# Altium footprint library iuh-thuc-hanh.PcbLib: 63 footprints (part 2 of 4)
Each footprint in its own frame and in the unit in brackets; x right, y up, seen from the top. Pads: shape width x height; smd on the part's side, far side on the other; paste and mask are expansions set on the pad; w line width, h text height; cw(c..) or ccw(c..) is an arc to the next point about the centre after c.
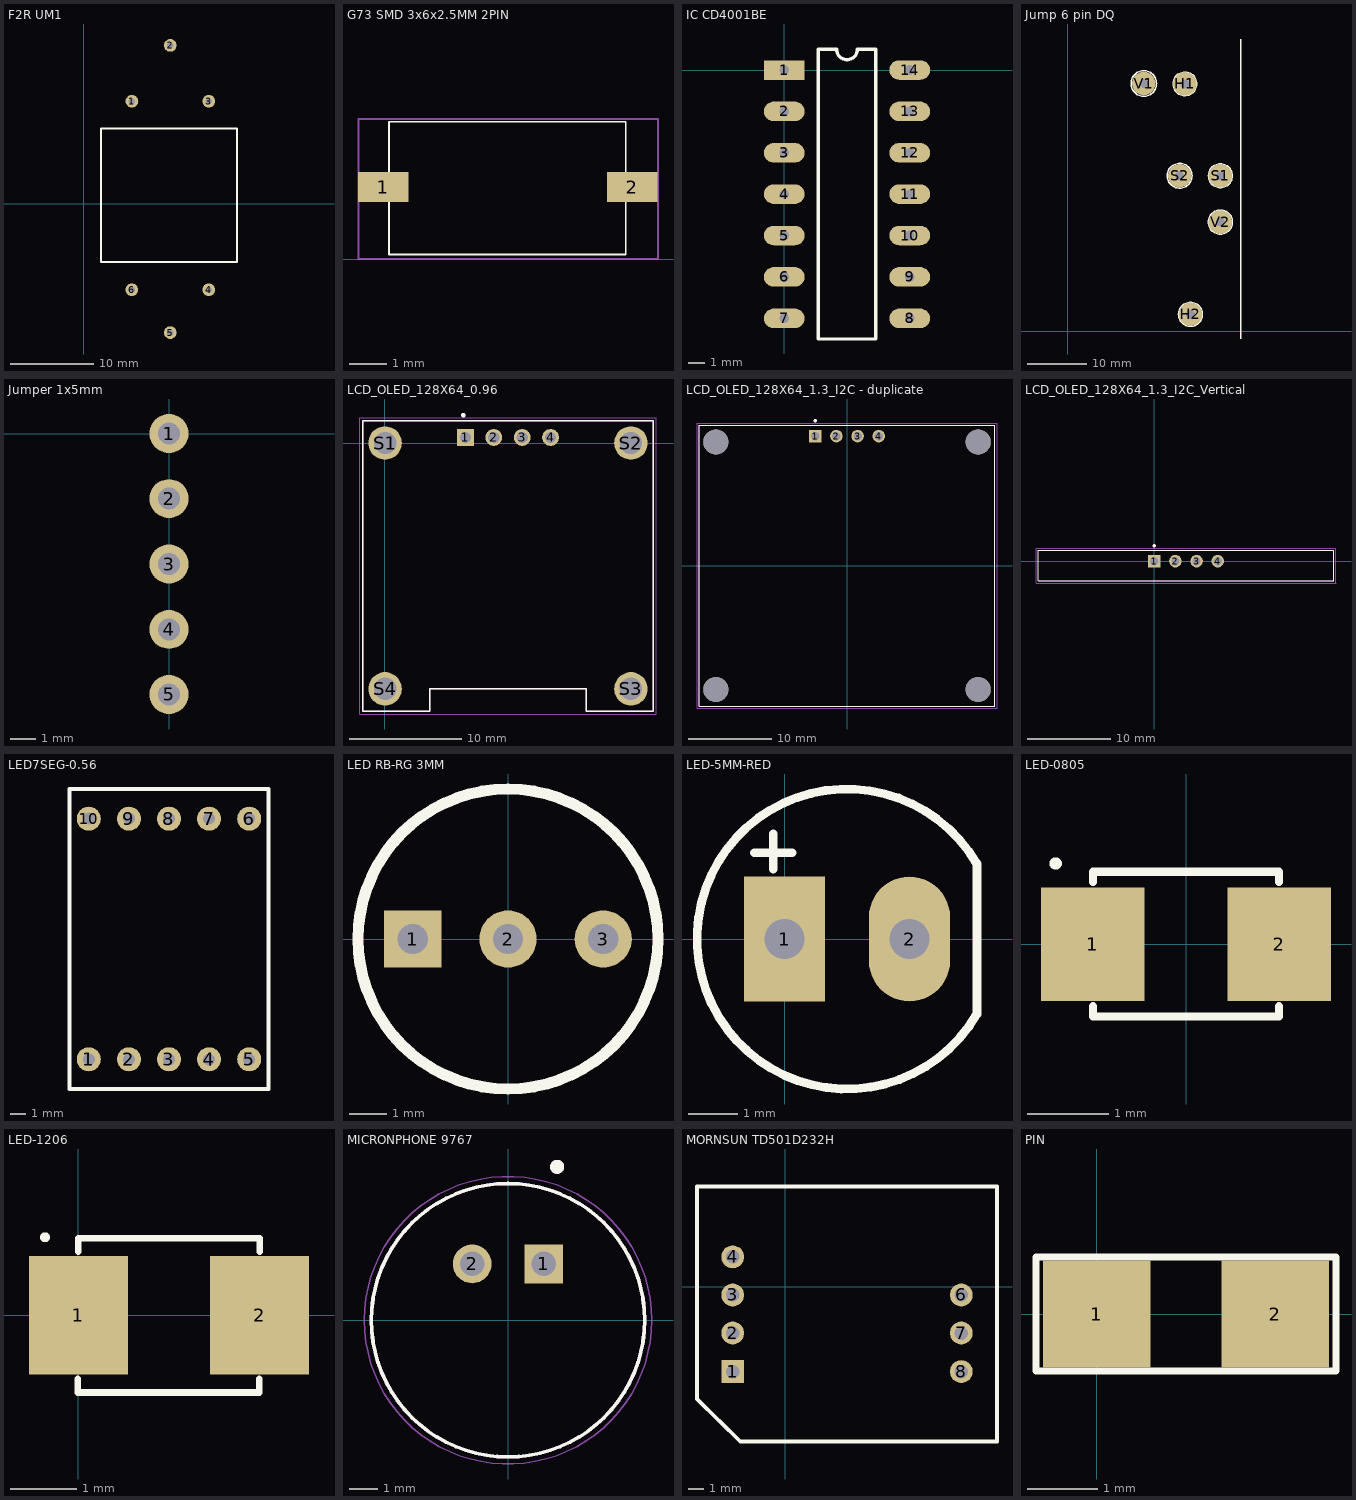
[diagram p1: the footprints below, top view; thin cyan lines are the x and y axes]

## F2R UM1 [mil]
pads (6):
  round 60 hole 30: 1(227.79,482.5) 2(408.58,745.59) 3(590,482.5) 4(589.71,-405) 5(408.58,-606.85) 6(227.5,-405)
Top Overlay:
  lines w10: 82.5,-275 722.5,-275 722.5,337.5 722.5,355 82.5,355 82.5,-275
3D body: height 314.96, standoff 0, extent 77.5,-275 720,357.5

## G73 SMD 3x6x2.5MM 2PIN [mm] "Tactile Tact Push Button Micro Switch"
pads (2):
  rect 1.35x0.8 smd mask+0.102: 1(1.829,1.93) 2(8.509,1.93)
Top Overlay:
  lines w0.05: 1.981,0.127 1.981,3.683 8.331,3.683 8.331,0.127 1.981,0.127
Mechanical 15:
  lines w0.05: 1.168,0 9.195,0 9.195,3.759 1.168,3.759 1.168,0
3D body "G73 button.STEP": height 2.5, standoff 0, extent 1.168,0.155 9.168,3.655

## IC CD4001BE [mm]
pads (14):
  rect 2.5x1.2 hole 0.6: 1(0,0)
  oval 2.5x1.2 hole 0.6: 2(0,-2.54) 3(0,-5.08) 4(0,-7.62) 5(0,-10.16) 6(0,-12.7) 7(0,-15.24) 8(7.7,-15.24) 9(7.7,-12.7) 10(7.7,-10.16) 11(7.7,-7.62) 12(7.7,-5.08) 13(7.7,-2.54) 14(7.7,0)
Top Overlay:
  lines w0.2: 2.085,-16.51 5.615,-16.51 5.615,1.27 4.485,1.27 cw(c3.85,1.27) 3.215,1.27 2.085,1.27 2.085,-16.51

## Jump 6 pin DQ [mm]
pads (6):
  round 4 hole 1.5: H1(19.875,42.037) H2(20.828,2.857) S1(25.908,26.416) S2(18.986,26.416) V1(12.89,42.1) V2(25.908,18.542)
Top Overlay:
  circle w0.254: c20.828,2.857 r2.041
  circle w0.254: c25.908,18.542 r2.048
  circle w0.254: c25.908,26.416 r2.032
  circle w0.254: c18.986,26.416 r2.111
  circle w0.254: c19.875,42.037 r2.005
  circle w0.254: c12.89,42.1 r2.172
  lines w0.254: 29.41,-1.333 29.41,49.666

## Jumper 1x5mm [mil] "Jumper 1x5-2.54mm"
pads (5):
  round 60 hole 33.46: 1(0,0) 2(0,-100) 3(0,-200.46) 4(0,-300.85) 5(0,-400.85)
3D body "Header, Male, 2.54mm, 1x5.STEP": height 336.22, standoff -118.11, extent -50.12,-450.85 49.88,49.15

## LCD_OLED_128X64_0.96 [mm] "I2C-"
pads (8):
  rect 1.508x1.508 / inner round 1.508 / far side rect 1.508x1.508 hole 1: 1(7.215,0.525)
  round 1.508 hole 1: 2(9.755,0.525) 3(12.295,0.525) 4(14.835,0.525)
  round 3 hole 2: S1(0.025,0.025) S2(22.025,0.025) S3(22.025,-21.975) S4(0.025,-21.975)
Top Overlay:
  circle w0.2: c7.025,2.525 r0.1
  lines w0.127: -1.975,-23.975 -1.975,2.025 24.025,2.025 24.025,-23.975 18.025,-23.975 18.025,-21.975 4.025,-21.975 4.025,-23.975 -1.975,-23.975
Mechanical 13:
  circle w0.2: c7.025,2.525 r0.1
  lines w0.127: -1.975,-23.975 -1.975,2.025 24.025,2.025 24.025,-23.975 18.025,-23.975 18.025,-21.975 4.025,-21.975 4.025,-23.975 -1.975,-23.975
Mechanical 15:
  lines w0.05: -2.225,-24.225 -2.225,2.275 24.275,2.275 24.275,-24.225 -2.225,-24.225
3D body "step_temp.STEP": height 5.66, standoff -5.64, extent -1.975,-23.975 24.025,2.025

## LCD_OLED_128X64_1.3_I2C - duplicate [mm]
pads (8):
  rect 1.508x1.508 / inner round 1.508 / far side rect 1.508x1.508 hole 1: 1(-3.81,15.55)
  round 1.508 hole 1: 2(-1.27,15.55) 3(1.27,15.55) 4(3.81,15.55)
  round 3 hole 3 unplated: ""(-15.75,-14.85) ""(-15.75,14.85) ""(15.75,-14.85) ""(15.75,14.85)
Top Overlay:
  circle w0.2: c-3.81,17.4 r0.1
  lines w0.127: -17.75,-16.85 -17.75,16.85 17.75,16.85 17.75,-16.85 -17.75,-16.85
Mechanical 13:
  circle w0.2: c-3.81,17.4 r0.1
  lines w0.127: -17.75,-16.85 -17.75,16.85 17.75,16.85 17.75,-16.85 -17.75,-16.85
Mechanical 15:
  lines w0.05: -18,-17.1 18,-17.1 18,17.1 -18,17.1 -18,-17.1
3D body "AZ-Delivery - OLED13 IIC.stp": height 2.1, standoff -9.1, extent -17.637,-16.133 17.764,17.367

## LCD_OLED_128X64_1.3_I2C_Vertical [mm]
pads (4):
  rect 1.508x1.508 / inner round 1.508 / far side rect 1.508x1.508 hole 1: 1(0,0.005)
  round 1.508 hole 1: 2(2.54,0.005) 3(5.08,0.005) 4(7.62,0.005)
Top Overlay:
  circle w0.2: c0,1.855 r0.1
  lines w0.127: -13.94,-2.372 -13.94,1.305 21.56,1.305 21.56,-2.372 -13.94,-2.372
Mechanical 13:
  circle w0.2: c0,1.855 r0.1
  lines w0.127: -13.94,1.305 21.56,1.305 21.56,-2.372 -13.737,-2.372
Mechanical 15:
  lines w0.05: -14.199,-2.622 21.819,-2.616 ; -14.19,-2.591 -14.19,1.555 21.81,1.555 21.81,-2.616
3D body "1x4.STEP": height 8.8, standoff -8.84, extent -1.194,-1.27 8.966,1.27

## LED7SEG-0.56 [mil]
pads (10):
  round 60 hole 30: 1(-2778.56,5986.53) 2(-2678.56,5986.53) 3(-2578.56,5986.53) 4(-2478.56,5986.53) 5(-2378.56,5986.53) 6(-2378.56,6586.53) 7(-2478.56,6586.53) 8(-2578.56,6586.53) 9(-2678.56,6586.53) 10(-2778.56,6586.53)
Top Overlay:
  lines w10: -2826.59,5912.52 -2826.59,6660.55 -2330.53,6660.55 -2330.53,5912.52 -2826.59,5912.52
3D body "Led 7 Segment 5611AS Red CC.STEP": height 314.96, standoff -78.74, extent -2823.03,5911.97 -2326.97,6660

## LED RB-RG 3MM [mil]
pads (3):
  rect 60x60 hole 31.5: 1(-100,0)
  round 60 hole 31.5: 2(0,0) 3(100,0)
Top Overlay:
  circle w11.81: c0,0 r157.48
3D body "Bi-Color LED - Common Cathode v3.step": height 405.51, standoff -925.2, extent -109.06,-74.26 109.06,74.26

## LED-5MM-RED [mil] "LED 2 PIN, 5mm, Only colour,pin to pin 100mil"
height 300
pads (2):
  rect 65x100 hole 32: 1(0,0)
  oval 65x100 hole 32: 2(100,0)
Top Overlay:
  lines w7: -24,69 6,69 ; -9,56 -9,84 ; 153.51,60.71 ccw(c50,0) 153.94,-59.97 ; 154,-59 154,60
3D body "SW3dPS-LEDd5R.STEP": height 339.18, standoff -243.49, extent -64.69,-119 148.69,117.99

## LED-0805 [mil]
pads (2):
  rect 50x55 smd: 1(-45,0) 2(45,0)
Top Overlay:
  circle w3.94: c-63,39 r1
  lines w4: -45,-30 -45,-35 45,-35 45,-30 ; -45,30 -45,35 45,35 45,30
3D body "User Library-led_0805-blue.step": height 43.31, standoff 0, extent -39.76,-24.6 39.77,24.61

## LED-1206 [mm]
pads (2):
  rect 1.5x1.8 smd: 1(0,0) 2(2.75,0)
Top Overlay:
  circle w0.1: c-0.506,1.185 r0.025
  lines w0.102: -0.007,-1.168 2.743,-1.168 2.743,-0.965 ; -0.007,-1.167 -0.007,-0.964 ; 0,0.965 0,1.168 2.75,1.168 ; 2.75,0.964 2.75,1.167
3D body "step_temp.STEP": height 1.2, standoff 0, extent -0.33,-0.8 2.87,0.8

## MICRONPHONE 9767 [mm]
pads (2):
  rect 1.378x1.378 hole 0.87: 1(1.27,2)
  round 1.378 hole 0.87: 2(-1.27,2)
Top Overlay:
  circle w0.127: c0,0 r4.85
  circle w0.3: c1.741,5.443 r0.1
Mechanical 13:
  circle w0.127: c0,0 r4.85
  circle w0.3: c1.741,5.443 r0.1
Mechanical 15:
  circle w0.05: c0,0 r5.1
3D body "electret mic 9.6x5x2.54 v5.step": height 5, standoff -2.73, extent -4.85,-4.596 4.85,5.104

## MORNSUN TD501D232H [mm]
pads (7):
  rect 1.524x1.524 hole 0.9: 1(-3.5,-5.65)
  round 1.524 hole 0.9: 2(-3.5,-3.08) 3(-3.5,-0.54) 4(-3.5,2) 6(11.74,-0.54) 7(11.74,-3.08) 8(11.74,-5.65)
Top Overlay:
  lines w0.254: -5.88,3.5 -5.88,3.645 -5.88,3.772 ; -5.88,-7.468 -5.88,6.69 14.12,6.69 14.12,-10.31 -3,-10.31 -5.88,-7.468
3D body "User Library-MORNSUN_TD301D232H.step": height 7.5, standoff -2, extent -5.809,-10.287 14.191,6.713

## PIN [mil]
pads (2):
  rect 60x60 smd: 1(0,0) 2(100,0)
Top Overlay:
  lines w3.94: -34,-32 134,-32 134,32 -34,32 -34,-32